# Altium footprint library cool_library.PcbLib: 1182 footprints (part 72 of 75)
Each footprint in its own frame and in the unit in brackets; x right, y up, seen from the top. Pads: shape width x height; smd on the part's side, far side on the other; paste and mask are expansions set on the pad; w line width, h text height; cw(c..) or ccw(c..) is an arc to the next point about the centre after c.
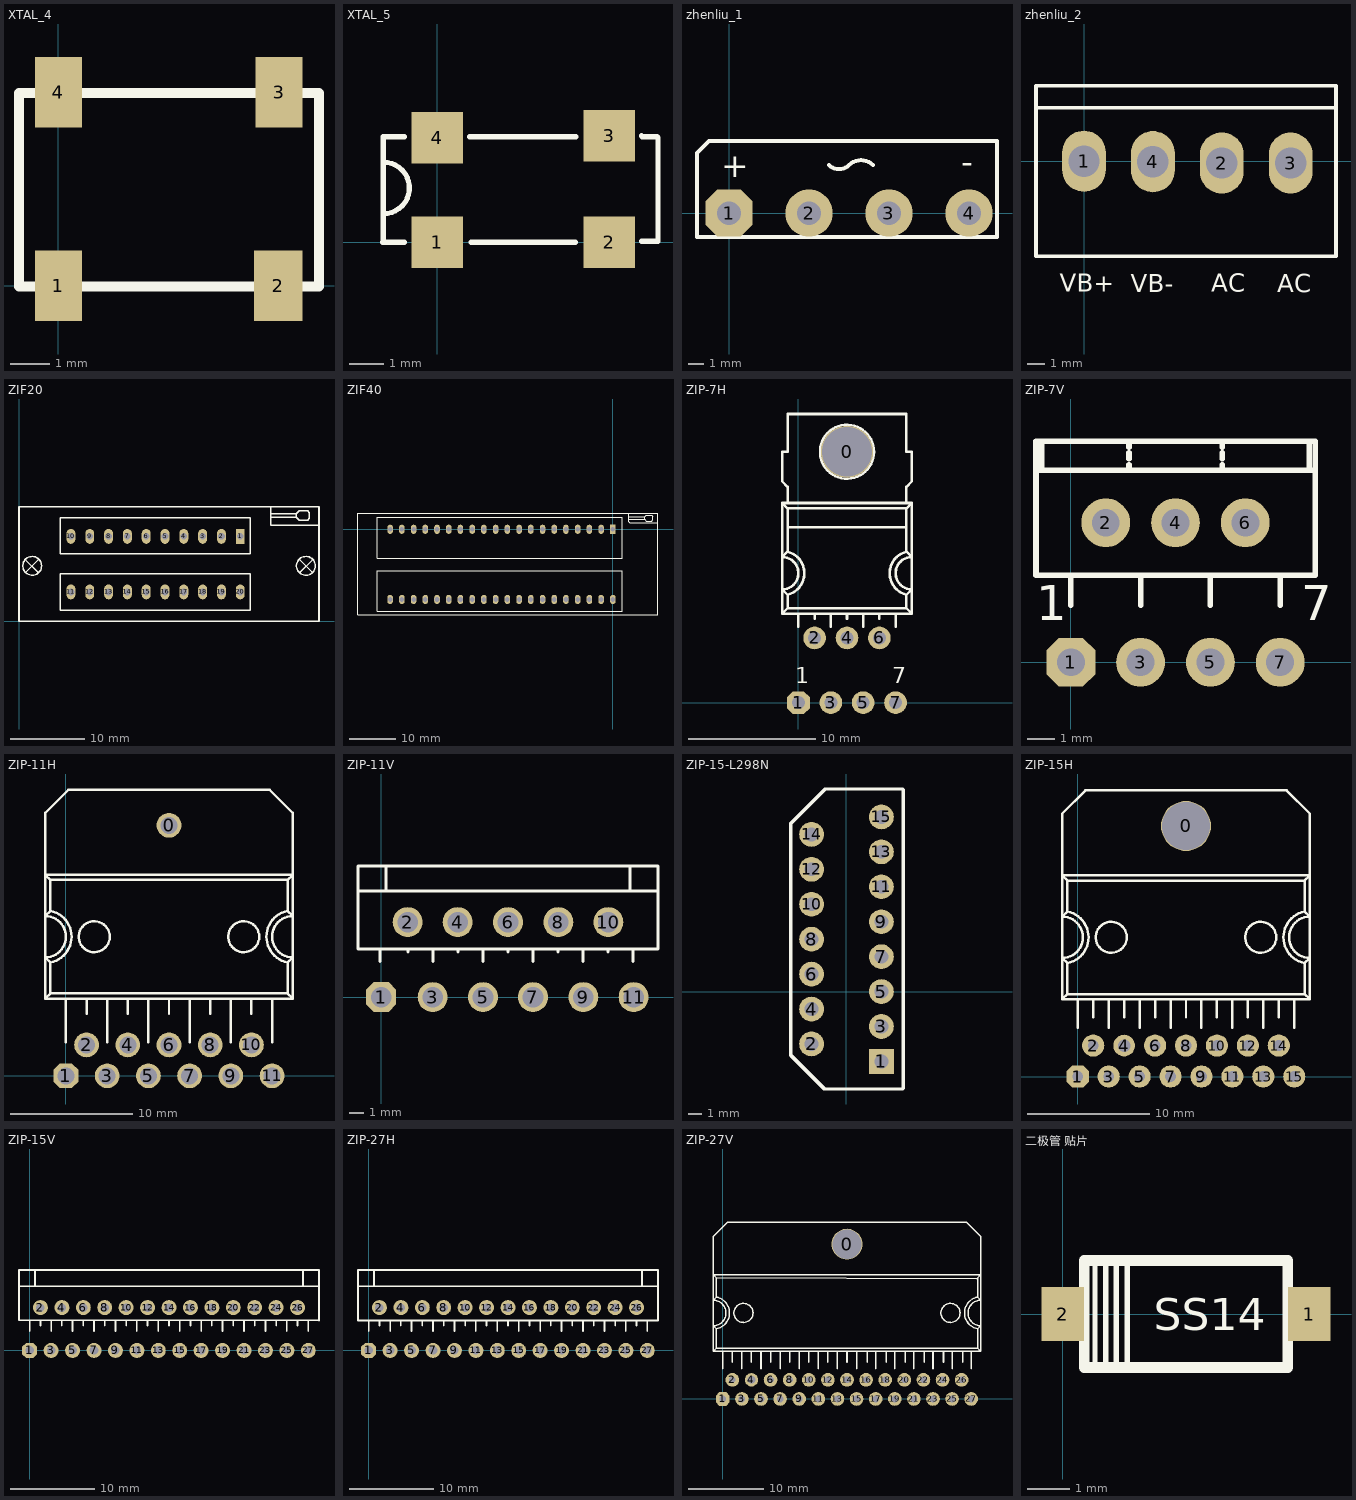
[diagram p71: the footprints below, top view; thin cyan lines are the x and y axes]

## XTAL_4 [mil]
pads (4):
  rect 47.24x70 smd: 1(0,0) 3(220,193) 4(0,193)
  rect 48.42x70 smd: 2(219,0)
Top Overlay:
  lines w10: -39.37,-0.81 259.84,-0.81 259.84,192.1 -39.37,192.1 -39.37,-0.81

## XTAL_5 [mm]
pads (4):
  rect 1.5x1.5 smd: 1(0,0) 2(5.003,0) 3(5.003,3.098) 4(0,3.048)
Top Overlay:
  lines w0.152: -1.581,0.831 ccw(c-1.562,1.58) -1.581,2.329 ; -0.966,0 -1.601,0 -1.575,0.025 -1.575,3.073 -0.966,3.073 ; 0.939,3.073 4.038,3.073 ; 0.99,0 4.013,0 ; 5.943,0.025 6.426,0.025 6.426,3.048 6.4,3.073 5.969,3.073 5.943,3.098

## zhenliu_1 [mm]
pads (4):
  oct 3x3 hole 1.5: 1(0,0)
  round 3 hole 1.5: 2(5.08,0) 3(10.16,0) 4(15.24,0)
Top Overlay:
  lines w0.254: 6.35,3.048 ccw(c6.985,3.683) 7.62,3.048 cw(c8.382,2.286) 9.144,3.048 ; -2.032,-1.524 -2.032,2.794 -2.032,3.81 -1.27,4.572 -0.254,4.572 17.018,4.572 17.018,-1.524 -2.032,-1.524
  text "-" at 14.732,2.54 h1.52
  text "+" at -0.508,2.286 h1.52

## zhenliu_2 [mm]
pads (4):
  oval 2.5x3.5 hole 1.8: 1(0,0) 2(7.874,-0.102) 3(11.811,-0.102) 4(3.937,-0.025)
Top Overlay:
  lines w0.2: -2.743,3.048 14.402,3.048
  lines w0.203: -2.743,-5.436 -2.743,4.318 14.402,4.318 14.402,-5.436 -2.743,-5.436
  text "VB+" at -1.397,-7.468 h1.02
  text "VB-" at 2.667,-7.493 h1.02
  text "AC" at 7.264,-7.468 h1.02
  text "AC" at 11.049,-7.493 h1.02

## ZIF20 [mm]
pads (20):
  rect 1.2x2 hole 0.9: 1(29.87,11.479)
  oval 1.2x2 hole 0.9: 2(27.33,11.479) 3(24.79,11.479) 4(22.25,11.479) 5(19.71,11.479) 6(17.17,11.479) 7(14.63,11.479) 8(12.09,11.479) 9(9.55,11.479) 10(7.01,11.479) 11(7.01,3.979) 12(9.55,3.979) 13(12.09,3.979) 14(14.63,3.979) 15(17.17,3.979) 16(19.71,3.979) 17(22.25,3.979) 18(24.79,3.979) 19(27.33,3.979) 20(29.87,3.979)
Top Overlay:
  circle w0.2: c38.722,7.5 r1.27
  circle w0.2: c1.778,7.5 r1.27
  lines w0.2: 34,14.046 36.413,14.046 37.429,14.046 ; 34,14.554 36.921,14.554 37.429,14.554 ; 37.429,14.046 37.429,14.554 ; 37.429,14.046 37.81,13.665 38.953,13.665 39.207,13.919 39.207,14.681 38.953,14.935 37.81,14.935 37.429,14.554
  lines w0.203: 0.889,8.306 2.591,6.604 ; 0.94,6.655 2.642,8.357 ; 34,15.5 34,13 40.479,13 ; 37.858,8.357 39.56,6.655 ; 37.909,6.604 39.611,8.306 ; 0,0 0,15.5 40.5,15.5 40.5,0 0,0 ; 5.537,1.473 31.217,1.473 31.217,6.41 5.537,6.41 5.537,1.473 ; 5.537,9.116 31.217,9.116 31.217,14.027 5.537,14.027 5.537,9.116

## ZIF40 [mm]
pads (40):
  rect 1.2x2 hole 1: 1(0,0)
  oval 1.2x2 hole 1: 2(-2.54,0) 3(-5.08,0) 4(-7.62,0) 5(-10.16,0) 6(-12.7,0) 7(-15.24,0) 8(-17.78,0) 9(-20.32,0) 10(-22.86,0) 11(-25.4,0) 12(-27.94,0) 13(-30.48,0) 14(-33.02,0) 15(-35.56,0) 16(-38.1,0) 17(-40.64,0) 18(-43.18,0) 19(-45.72,0) 20(-48.26,0) 21(-48.26,-15.2) 22(-45.72,-15.2) 23(-43.18,-15.2) 24(-40.64,-15.2) 25(-38.1,-15.2) 26(-35.56,-15.2) 27(-33.02,-15.2) 28(-30.48,-15.2) 29(-27.94,-15.2) 30(-25.4,-15.2) 31(-22.86,-15.2) 32(-20.32,-15.2) 33(-17.78,-15.2) 34(-15.24,-15.2) 35(-12.7,-15.2) 36(-10.16,-15.2) 37(-7.62,-15.2) 38(-5.08,-15.2) 39(-2.54,-15.2) 40(0,-15.2)
Top Overlay:
  lines w0.2: 3.429,2.159 5.842,2.159 6.858,2.159 ; 3.429,2.667 6.35,2.667 6.858,2.667 ; 6.858,2.159 7.239,1.778 8.382,1.778 8.636,2.032 8.636,2.794 8.382,3.048 7.239,3.048 6.858,2.667 ; 6.858,2.159 6.858,2.667
  lines w0.203: 1.956,-17.765 -51.054,-17.765 -51.054,-9.002 2.007,-9.002 2.007,-17.816 ; 3.429,3.48 3.429,1.626 3.658,1.397 9.78,1.397 ; -55.22,-18.52 9.78,-18.52 9.78,3.48 -55.22,3.48 -55.22,-18.52 ; -51.054,-6.299 -51.054,2.565 2.007,2.565 2.007,-6.299 -51.054,-6.299

## ZIP-7H [mil]
pads (8):
  round 161.65 hole 154.17: 0(150,775)
  oct 70x70 hole 40: 1(0,0)
  round 70 hole 40: 2(50,200) 3(100,0) 4(150,200) 5(200,0) 6(250,200) 7(300,0)
Top Overlay:
  circle w8: c150,775 r83.33
  lines w8: -33.47,333.7 ccw(c-50,400) -33.47,466.3 ; -33.33,541.67 333.33,541.67 ; -33.33,616.67 -33.33,666.67 -50,683.33 -50,775 -33.33,775 -33.33,891.67 333.33,891.67 333.33,775 350,775 350,683.33 333.33,666.67 333.33,616.67 ; 0,234.46 0,275 ; 50,259.06 50,275 ; 100,234.25 100,275 ; 150,259.06 150,275 ; 200,234.25 200,275 ; 250,259.06 250,275 ; 300,234.25 300,275 ; 333.47,333.7 cw(c350,400) 333.47,466.3 ; -50,275 350,275 ; -50,275 -50,616.67 ; -50,275 -33.33,291.67 ; -50,616.67 350,616.67 ; -50,616.67 -33.33,600 ; -33.33,291.67 333.33,291.67 ; -33.33,291.67 -33.33,333.33 -50,350 ccw(c-50,400) -50,450 -33.33,466.67 -33.33,600 ; -33.33,600 333.33,600 ; 333.33,291.67 333.33,333.33 350,350 cw(c350,400) 350,450 333.33,466.67 333.33,600 ; 333.33,291.67 350,275 ; 333.33,600 350,616.67 ; 350,275 350,616.67
  text "1" at -10,60 h50
  text "7" at 290,60 h50

## ZIP-7V [mil]
pads (7):
  oct 70x70 hole 40: 1(0,0)
  round 70 hole 40: 2(50,200) 3(100,0) 4(150,200) 5(200,0) 6(250,200) 7(300,0)
Top Overlay:
  lines w8: -50,275 350,275 ; -41.67,275 -41.67,316.67 ; 0,81.89 0,125 ; 83.33,275 83.33,283.33 ; 83.33,291.67 83.33,300 ; 83.33,308.33 83.33,316.67 ; 100,81.89 100,125 ; 200,81.89 200,125 ; 216.67,275 216.67,283.33 ; 216.67,291.67 216.67,300 ; 216.67,308.33 216.67,316.67 ; 300,81.89 300,125 ; 341.67,275 341.67,316.67 ; -50,125 350,125 350,316.67 -50,316.67 -50,125
  text "7" at 330,60 h50
  text "1" at -50,60 h50

## ZIP-11H [mil]
pads (12):
  round 80 hole 55: 0(333.33,810) 2(66.67,100) 3(133.33,0) 4(200,100) 5(266.67,0) 6(333.33,100) 7(400,0) 8(466.67,100) 9(533.33,0) 10(600,100) 11(666.67,0)
  oct 80x80 hole 55: 1(0,0)
Top Overlay:
  circle w8: c575,450 r50
  circle w8: c91.67,450 r50
  lines w8: -50.45,366.56 ccw(c-66.67,450) -50.45,533.44 ; 0,108.33 0,250 ; 66.67,200 66.67,250 ; 133.33,108.33 133.33,250 ; 200,200 200,250 ; 266.67,108.33 266.67,250 ; 333.33,200 333.33,250 ; 400,108.33 400,250 ; 466.67,200 466.67,250 ; 533.33,108.33 533.33,250 ; 600,200 600,250 ; 666.67,108.33 666.67,250 ; 717.11,366.56 cw(c733.33,450) 717.11,533.44 ; -66.67,250 -50,266.67 ; -66.67,250 733.33,250 ; -66.67,250 -66.67,650 ; -66.67,650 -50,633.33 ; -66.67,650 733.33,650 ; -66.67,650 -66.67,850 8.33,925 658.33,925 733.33,850 733.33,650 ; -50,266.67 -50,366.67 -66.67,383.33 ccw(c-66.67,450) -66.67,516.67 -50,533.33 -50,633.33 ; -50,266.67 716.67,266.67 ; -50,633.33 716.67,633.33 ; 716.67,266.67 733.33,250 ; 716.67,266.67 716.67,366.67 733.33,383.33 cw(c733.33,450) 733.33,516.67 716.67,533.33 716.67,633.33 ; 716.67,633.33 733.33,650 ; 733.33,250 733.33,650

## ZIP-11V [mil]
pads (11):
  oct 80x80 hole 55: 1(0,0)
  round 80 hole 55: 2(70.83,200) 3(137.5,0) 4(204.17,200) 5(271.67,0) 6(338.33,200) 7(405,0) 8(472.5,200) 9(539.17,0) 10(605.83,200) 11(673.33,0)
Top Overlay:
  lines w8: -3.33,94.89 -3.33,128.23 ; 13.33,283.33 13.33,350 ; 71.67,119.89 71.67,128.23 ; 138.33,94.89 138.33,128.23 ; 205,119.89 205,128.23 ; 271.67,94.89 271.67,128.23 ; 338.33,119.89 338.33,128.23 ; 405,94.89 405,128.23 ; 471.67,119.89 471.67,128.23 ; 538.33,94.89 538.33,128.23 ; 605,119.89 605,128.23 ; 663.33,283.33 663.33,350 ; 671.67,94.89 671.67,128.23 ; -61.67,283.33 -61.67,350 738.33,350 738.33,283.33 ; -61.67,283.33 738.33,283.33 ; -61.67,283.33 -61.67,128.23 738.33,128.23 738.33,283.33

## ZIP-15-L298N [mm] "直插封装"
pads (15):
  rect 1.8x1.8 hole 1: 1(2.54,-5.08)
  round 1.8 hole 1: 2(-2.54,-3.81) 3(2.54,-2.54) 4(-2.54,-1.27) 5(2.54,0) 6(-2.54,1.27) 7(2.54,2.54) 8(-2.54,3.81) 9(2.54,5.08) 10(-2.54,6.35) 11(2.54,7.62) 12(-2.54,8.89) 13(2.54,10.16) 14(-2.54,11.43) 15(2.54,12.7)
Top Overlay:
  lines w0.254: -4.039,-4.648 -1.6,-7.087 4.064,-7.087 4.115,-7.036 4.115,14.681 4.064,14.732 -1.549,14.732 -4.039,12.243 -4.039,-4.648

## ZIP-15H [mil]
pads (16):
  round 161.67 hole 154.17: 0(350,810)
  oct 71.67x71.67 hole 35: 1(0,0)
  round 71.67 hole 35: 2(50,100) 3(100,0) 5(200,0) 6(250,100) 7(300,0) 8(350,100) 9(400,0) 10(450,100) 11(500,0) 12(550,100) 13(600,0) 14(650,100) 15(700,0)
  round 70 hole 40: 4(150,100)
Top Overlay:
  circle w8: c108.33,450 r50
  circle w8: c591.67,450 r50
  lines w8: -33.78,366.56 ccw(c-50,450) -33.78,533.44 ; 0,157.48 0,250 ; 50,191.67 50,250 ; 100,157.48 100,250 ; 150,191.67 150,250 ; 200,157.48 200,250 ; 250,191.67 250,250 ; 300,157.48 300,250 ; 350,191.67 350,250 ; 400,157.48 400,250 ; 450,191.67 450,250 ; 500,157.48 500,250 ; 550,191.67 550,250 ; 600,157.48 600,250 ; 650,191.67 650,250 ; 700,157.48 700,250 ; 733.78,366.56 cw(c750,450) 733.78,533.44 ; -50,250 -50,650 ; -50,250 750,250 ; -50,250 -33.33,266.67 ; -50,650 -50,850 25,925 675,925 750,850 750,650 ; -50,650 750,650 ; -50,650 -33.33,633.33 ; -33.33,266.67 733.33,266.67 ; -33.33,266.67 -33.33,366.67 -50,383.33 ccw(c-50,450) -50,516.67 -33.33,533.33 -33.33,633.33 ; -33.33,633.33 733.33,633.33 ; 733.33,266.67 733.33,366.67 750,383.33 cw(c750,450) 750,516.67 733.33,533.33 733.33,633.33 ; 733.33,266.67 750,250 ; 733.33,633.33 750,650 ; 750,250 750,650

## ZIP-15V [mil]
pads (27):
  oct 70x70 hole 40: 1(0,0)
  round 70 hole 40: 2(50,200) 3(100,0) 4(150,200) 5(200,0) 6(250,200) 7(300,0) 8(350,200) 9(400,0) 10(450,200) 11(500,0) 12(550,200) 13(600,0) 14(650,200) 15(700,0) 16(750,200) 17(800,0) 18(850,200) 19(900,0) 20(950,200) 21(1000,0) 22(1050,200) 23(1100,0) 24(1150,200) 25(1200,0) 26(1250,200) 27(1300,0)
Top Overlay:
  lines w8: -50.16,140.91 -50,283.33 -50,375 1345,375 ; -50,140.91 1350,140 ; -50,300 1350,300 ; 0,90.91 0,140.91 ; 25,300 25,375 ; 50,115.91 50,140.91 ; 100,90.91 100,140.91 ; 150,115.91 150,140.91 ; 200,90.91 200,140.91 ; 250,115.91 250,140.91 ; 300,90.91 300,140.91 ; 350,115.91 350,140.91 ; 400,90.91 400,140.91 ; 450,115.91 450,140.91 ; 500,90.91 500,140.91 ; 550,115.91 550,140.91 ; 600,90.91 600,140.91 ; 650,115.91 650,140.91 ; 700,90 700,140 ; 750,115.91 750,140.91 ; 800,90.91 800,140.91 ; 850,115.91 850,140.91 ; 900,90.91 900,140.91 ; 950,115.91 950,140.91 ; 1000,90.91 1000,140.91 ; 1050,115.91 1050,140.91 ; 1100,90.91 1100,140.91 ; 1150,115.91 1150,140.91 ; 1200,90.91 1200,140.91 ; 1250,115.91 1250,140.91 ; 1275,300 1275,375 ; 1300,90.91 1300,140.91 ; 1350,140.91 1350,300 ; 1350,375 1350,300

## ZIP-27H [mil]
pads (27):
  oct 70x70 hole 40: 1(0,0)
  round 70 hole 40: 2(50,200) 3(100,0) 4(150,200) 5(200,0) 6(250,200) 7(300,0) 8(350,200) 9(400,0) 10(450,200) 11(500,0) 12(550,200) 13(600,0) 14(650,200) 15(700,0) 16(750,200) 17(800,0) 18(850,200) 19(900,0) 20(950,200) 21(1000,0) 22(1050,200) 23(1100,0) 24(1150,200) 25(1200,0) 26(1250,200) 27(1300,0)
Top Overlay:
  lines w8: -50.16,140.91 -50,283.33 -50,375 1345,375 ; -50,140 1350,140 ; -50,300 1350,300 ; 0,90 0,140 ; 25,300 25,375 ; 50,115 50,140 ; 100,90 100,140 ; 150,115 150,140 ; 200,90 200,140 ; 250,115 250,140 ; 300,90 300,140 ; 350,115 350,140 ; 400,90 400,140 ; 450,115 450,140 ; 500,90 500,140 ; 550,115 550,140 ; 600,90 600,140 ; 650,115 650,140 ; 700,90 700,140 ; 750,115 750,140 ; 800,90 800,140 ; 850,115 850,140 ; 900,90 900,140 ; 950,115 950,140 ; 1000,90 1000,140 ; 1050,115 1050,140 ; 1100,90 1100,140 ; 1150,115 1150,140 ; 1200,90 1200,140 ; 1250,115 1250,140 ; 1275,300 1275,375 ; 1300,90 1300,140 ; 1350,140.91 1350,300 ; 1350,375 1350,300

## ZIP-27V [mil]
pads (28):
  round 161.67 hole 154.17: 0(650,810)
  oct 71.67x71.67 hole 35: 1(0,0)
  round 71.67 hole 35: 2(50,100) 3(100,0) 5(200,0) 6(250,100) 7(300,0) 8(350,100) 9(400,0) 10(450,100) 11(500,0) 12(550,100) 13(600,0) 14(650,100) 15(700,0) 16(750,100) 17(800,0) 18(850,100) 19(900,0) 20(950,100) 21(1000,0) 22(1050,100) 23(1100,0) 24(1150,100) 25(1200,0) 26(1250,100) 27(1300,0)
  round 70 hole 40: 4(150,100)
Top Overlay:
  circle w8: c1191.67,450 r50
  circle w8: c108.33,450 r50
  lines w8: -33.78,366.56 ccw(c-50,450) -33.78,533.44 ; 0,157.48 0,250 ; 50,191.67 50,250 ; 100,157.48 100,250 ; 150,191.67 150,250 ; 200,157.48 200,250 ; 250,191.67 250,250 ; 300,157.48 300,250 ; 350,191.67 350,250 ; 400,157.48 400,250 ; 450,191.67 450,250 ; 500,157.48 500,250 ; 550,191.67 550,250 ; 600,157.48 600,250 ; 650,191.67 650,250 ; 700,157.48 700,250 ; 755,191.67 755,250 ; 800,157.48 800,250 ; 855,191.67 855,250 ; 900,157.48 900,250 ; 955,191.67 955,250 ; 1000,157.48 1000,250 ; 1055,191.67 1055,250 ; 1100,157.48 1100,250 ; 1155,191.67 1155,250 ; 1200,157.48 1200,250 ; 1255,191.67 1255,250 ; 1300,157.48 1300,250 ; 1330,630 -33.33,633.33 ; 1333.78,366.56 cw(c1350,450) 1333.78,533.44 ; 1335,265 -33.33,266.67 ; -50,250 -50,650 ; -50,250 1350,250 ; -50,250 -33.33,266.67 ; -50,650 -50,850 25,925 1275,925 1350,850 1350,650 ; -50,650 1350,650 ; -50,650 -33.33,633.33 ; -33.33,266.67 -33.33,366.67 -50,383.33 ccw(c-50,450) -50,516.67 -33.33,533.33 -33.33,633.33 ; 1350,250 1350,650 ; 1350,250 1333.33,266.67 1333.33,366.67 1350,383.33 cw(c1350,450) 1350,516.67 1333.33,533.33 1333.33,633.33 1350,650

## 二极管 贴片 [mil]
pads (2):
  rect 40x50 smd: 1(230,0) 2(0,0)
Top Overlay:
  lines w5: 30,-50 30,50 ; 40,-50 40,50 ; 50,-50 50,50 ; 60,-50 60,50
  lines w10: 20,-50 210,-50 210,50 20,50 20,-50
  text "SS14" at 85,-15 h30